# Altium integrated library CMR_Miscellaneous_Devices.IntLib: 110 symbols (continued)
## LMR23630-Q1
designator U?
Manufacturer: Texas Instruments; Manufacturer Part Number: LMR23630AFQDDARQ1; Function: Step-Down; Output Configuration: Positive; Topology: Buck; Output Type: Adjustable; Number of Outputs: 1; Voltage - Input (Min): 4.5V; Voltage - Input (Max): 36V; Voltage - Output (Min/Fixed): 1V; Voltage - Output (Max): 28V; Current - Output: 3A; Frequency - Switching: 400kHz; Synchronous Rectifier: Yes; Supplier 1: Digi-Key; RoHS: RoHS Compliant; Category: Integrated Circuits (ICs); Stock 1: 1636; Pricing 1: 1=3.97, 10=3.564, 100=2.9204, 500=2.48604, 1000=2.09667 (USD); Packaging: Digi-Reel®; Part Status: Active; Operating Temperature: -40°C ~ 125°C (TJ); Mounting Type: Surface Mount; Package / Case: 8-SOIC (0.154", 3.90mm Width) Exposed Pad; Supplier Device Package: 8-SO PowerPad; ComponentLink1URL: http://www.ti.com/lit/ds/symlink/lmr23630-q1.pdf; ComponentLink1Description: http://www.ti.com/lit/ds/symlink/lmr23630-q1.pdf; Supplier Part Number 1: 296-45260-6-ND
footprint DDA0008E_N (SOP, 8-Leads, Body 4x5mm, Pitch 1.27mm, Thermal Pad 2.4x3.1mm, IPC Medium Density)
pins: 1 SW, 2 BOOT, 3 VCC, 4 FB (in), 5 EN/SYNC (in), 6 AGND, 7 VIN, 8 PGND, 9 PAD

## LRTB R98G RGB LED
designator D?, comment LRTB R98G
L98B R98G SMT RGB LED; Manufacturer: OSRAM; Datasheet: http://www.osram-os.com/Graphics/XPic9/00196779_0.pdf/LRTB%20R98G%20-%20Multi%20CHIPLED.pdf; Manufacturer Part Number: LRTB R98G; Supplier 1: Mouser; Supplier Part Number 1: 720-LRTBR98GR5T1S7T7
footprint LRTB R98G RGB LED (OSRAM SMT RGB LED LRTB R98G)
pins: 1, 2, 3, 4, 5, 6

## LTP-3784E
designator *  Supplier Part Number 1: 160-1010-ND
LED ALPHNUM.54" 2DGT RED-ORNG CC; Manufacturer: Lite-On Inc.; Manufacturer Part Number: LTP-3784E; Number of Characters: 2; Digit/Alpha Size: 0.54" (13.72mm); Display Type: 14-Segment, Alphanumeric; Common Pin: Common Cathode; Voltage - Forward (Vf) (Typ): 2V; Current - Test: 20mA; Millicandela Rating: 2.3mcd; Wavelength - Peak: 630nm; Power Dissipation (Max): 75mW; Supplier 1: Digi-Key; RoHS: RoHS Compliant; Category: Optoelectronics; Stock 1: 4674; Pricing 1: 1=3.78, 10=3.154, 25=2.6492, 100=2.2707, 250=2.0184, 500=1.82918, 1000=1.6778, 2500=1.60841, 5000=1.57688 (USD); Packaging: Tube; Part Status: Active; Size / Dimension: 0.833" H x 0.989" W x 0.307" D (21.15mm x 25.12mm x 7.80mm); Color: Orange-Red; Package / Case: 18-DIP; ComponentLink1URL: http://optoelectronics.liteon.com/upload/download/DS-30-96-084/S_110_P3784E.pdf; ComponentLink1Description: http://optoelectronics.liteon.com/upload/download/DS-30-96-084/S_110_P3784E.pdf
footprint Lite-On LTP-3784E
pins: 1 E, 2 M, 4 L, 5 K, 6 J, 7 D, 8 NP, 9 C, 10 B, 11 COM2, 12 A, 13 N, 14 H, 15 G, 16 COM1, 17 P, 18 F

## Main Board 15e
designator P?, comment Main Board Connection
15e's Main Board
footprint Main Board 15e (15e Main Board connection for DAQ node)
pins: 1, 2, 3, 4
text: VCC; MCU; GND; CANH; CANL

## MAX6955ATL+
designator *  Supplier Part Number 1: MAX6955ATL+-ND
IC DRVR DSPL LED 40-TQFN; Manufacturer: Maxim Integrated; Manufacturer Part Number: MAX6955ATL+; Configuration: 7, 14, 16 Segment; Interface: I²C; Current - Supply: 22mA; Voltage - Supply: 2.7 V ~ 5.5 V; Supplier 1: Digi-Key; RoHS: RoHS Compliant; Category: Integrated Circuits (ICs); Stock 1: 171; Pricing 1: 1=16.05, 10=15.248, 25=12.57, 50=11.9416, 250=11.571, 500=10.2765 (USD); Packaging: Tube; Part Status: Active; Display Type: LED; Digits or Characters: -; Operating Temperature: -40°C ~ 125°C; Mounting Type: Surface Mount; Package / Case: 40-WFQFN Exposed Pad; Supplier Device Package: 40-TQFN-EP (6x6); ComponentLink1URL: http://datasheets.maximintegrated.com/en/ds/MAX6955.pdf; ComponentLink1Description: http://datasheets.maximintegrated.com/en/ds/MAX6955.pdf
footprint QFN50P600X600X80_HS-41N (QFN, 40-Leads, Body 6.00x6.00mm, Pitch 0.50mm, Thermal Pad 4.10x4.10mm, IPC Medium Density)
pins: 1 AD1, 2 O0, 3 O1, 4 O2, 5 O3, 6 O4, 7 O5, 8 O6, 9 O7, 10 O8, 12 GND, 13 GND, 14 ISET, 15 GND, 16 V+, 17 OSC, 18 V+, 19 V+, 21 O9, 22 O10, 23 O11, 24 O12, 25 O13, 26 O14, 27 O15, 28 O16, 29 O17, 30 O18, 31 BLINK, 32 OSC_OUT, 33 P2, 34 P3, 35 P4/IRQ, 36 P0, 37 P1, 38 AD0, 39 SDA, 40 SCL

## MAX9860
designator *
footprint MAX9860
pins: 1 MICBIAS, 2 REG, 3 PREG, 4 REF, 5 AGND (power), 6 AVDD (power), 7 OUTP (out), 8 OUTN (out), 9 SDA (out), 10 SCL (in), 11 DVDDIO (power), 12 DGND (power), 13 DVDD (power), 14 MCLK (in), 15 SDOUT (out), 16 SDIN (in), 17 LRCLK (io), 18 BCLK (io), 19 ~{IRQ} (out), 20 MICRN (in), 21 MICRP (in), 22 MICLN (in), 23 MICLP (in), 24 MICGND (power), 25 EP (power)

## MAXI PC AUTO-FUSE SOCKET
designator F?, comment 500VAC 40A
FUSE BLOCK BLADE 500V 40A PCB; Manufacturer Part Number: 3555-2; Manufacturer: Keystone Electronics; Voltage Rating: 500V (AC); Current Rating: 40A; Datasheet URL: http://www.keyelco.com/userAssets/file/M60-2p38.pdf
footprint MAXI PC AUTO-FUSE SOCKET (FUSE BLOCK BLADE 500V 40A PCB)
pins: 1, 2

## Mentor Light Pipe for LED, 2 x 5MM
designator MP?, comment 1274.1011
Single LED Light Guide - 2mm x 5mm, 15mm height; Manufacturer: Mentor; Manufacturer Part Number: 1274.1011; Datasheet: http://www.tme.eu/en/Document/145e8fcdcc8fe86a85cd92160bd5d5db/1274.1011.pdf; Supplier 1: Farnell; Supplier Part Number 1: 2300569
footprint MENTOR 1274.1011 (MENTOR LIGHTPIPE FOR LED, 2 x 5MM)

## Mentor Quad Light Pipe for LED, 2 x 3MM
designator MP?, comment 1296.4134
LED Light Guide Array - 2mm x 3mm, 15mm height, 4 guides; Manufacturer: Mentor; Manufacturer Part Number: 1296.4134; Datasheet: http://www.farnell.com/datasheets/1693513.pdf; Supplier 1: Farnell; Supplier Part Number 1: 2300661
footprint MENTOR 1296.4134 (MENTOR QUAD LIGHTPIPE FOR LED, 2 x 3MM)

## MFU0805FF00750P100
designator F?
750mA, 32Vdc, SMT, Fast Blow, 0805; Breaking Capacity: 50 A; Current Rating: 750 mA; Voltage Rating: 32 Vdc; Package: 0805; Supplier 1: Digi-Key; Supplier Part Number 1: MFU0805.75CT-ND
footprint MFU Series 0805 (SMT Fuse, 0805, Vishay MFU Series)
pins: 1, 2

## MicroSD
designator P?
MicroSD card reader
footprint MicroSD
pins: 1 CD, 2 CS, 3 DI, 4 DO, 5 CLK, 6 GND, 7 3V, 8 5V

## Molex 0473080001
designator *
CONN SIM CARD PUSH-PULL R/A SMD
footprint Molex 0473080001
pins: 0 PAD, 1 C1, 2 C2, 3 C3, 5 C5, 6 C6, 7 C7

## NHD-320240WX
designator *
footprint NHD-320240WX (LCD Display)

## NTCG103JF103FT1S
designator RT?, comment value 10k  Tolerance: 1%  Supplier 1: Digi-Key  Supplier Part Number 1: 445-174506-6-ND  (hidden comment: NTC THERMISTOR 10K OHM 1% 0402)
Datasheet: http://www.bitechnologies.com/pdfs/22.pdf
footprint NTCG103JF103FT1S
pins: 1, 2
text: -temp

## NTCS0805E3103JHT
designator R?
NTC THERMISTOR R_25C = 10k, B=3380K; mfg p#: NTCG163JF103FTDS; Supplier Part #: 445-174516-1-ND; Datasheet: https://product.tdk.com/info/en/catalog/datasheets/503022/tpd_automotive_ntc-thermistor_ntcg_en.pdf
footprint 0603 NTC Thermistor (THERMISTOR NTC 10KOHM 3380K 0603)
pins: 1, 2
text: -temp

## Ohmite FCSL150R005FERCT
designator R?, comment 2m 1%
2m 1% 10W SMD Shunt Resistor; ComponentLink1Description: digikey; ComponentLink1URL: https://www.digikey.com/product-detail/en/ohmite/FCSL150R005FER/FCSL150R005FERCT-ND/4976432
footprint FCSL150
pins: 1, 2

## On-Off Power Button / Pushbutton Toggle Switch:1683
designator S?, comment Switchy Boi
On-Off Power Button / Pushbutton Toggle Switch:1683
footprint Pushbutton Toggle Switch (On-Off Power Button / Pushbutton Toggle Switch:1683)
pins: 1, 2

## OpenLog
designator U?  (value not drawn)
Open Source Data Logger; Datasheet: https://github.com/sparkfun/OpenLog/wiki/datasheet
footprint OpenLog (Openlog serial data logger)
pins: 1 GRN, 2 RXI, 3 TXO, 4 VCC, 5 GND, 6 BLK

## OSRAM LS R976
designator D?, comment LS R976  Color: Red
OSRAM CHIPLED 0805 Red, LSR976; Datasheet: http://www.osram-os.com/Graphics/XPic8/00078896_0.pdf; Manufacturer: OSRAM; Manufacturer Part Number: LS R976; Supplier 1: Digi-Key; Supplier Part Number 1: 475-1278-1-ND
footprint OSRAM LS R976 (OSRAM CHIPLED 0805 RED)
pins: 1, 2

## Panasonic EEE-1CA470WR
designator C?, comment CAP 47uF
16V 47uF Electrolytic Capacitor; Part: PCE4848CT-ND; Rated Voltage: 50 V; Capacitance: 1000 uF; Tolerance: 20%; Chemistry: Aluminum Electrolytic; Supplier: Digikey; ComponentLink1Description: digikey; ComponentLink1URL: https://www.digikey.com/product-detail/en/panasonic-electronic-components/EEE-1CA470WR/PCE3890TR-ND/766057
footprint EEE-1CA470WR
pins: 1, 2
text: +

## Panasonic EEEFK1H102AM
designator C?, comment CAP 1000uF
50V 1000uF Electrolytic Capacitor; Part: PCE4848CT-ND; Tolerance: 20%; Chemistry: Aluminum Electrolytic; Rated Voltage: 50 V; Capacitance: 1000 uF; Supplier: Digikey; ComponentLink1Description: Digikey; ComponentLink1URL: https://www.digikey.com/product-detail/en/panasonic-electronic-components/EEE-FK1H102AM/PCE4848CT-ND/1879879
footprint EEEFK1H102AM
pins: 1, 2
text: +

## Particle_Photon
designator U*, comment Particle Photon
footprint Particle Photon
footprint PARTICLE_PHOTON_SMD
pins: 1 VIN, 2 GND, 3 TX, 4 RX, 5 WKUP, 6 DAC, 7 A5, 8 A4, 9 A3, 10 A2, 11 A1, 12 A0, 13 D0, 14 D1, 15 D2, 16 D3, 17 D4, 18 D5, 19 D6, 20 D7, 21 GND, 22 VBAT, 23 ~{RST}, 24 3V3

## PE-68386NL
designator T?
Transformers Audio & Signal THT Gate Drive 785uH .6Ohms; Part Number: PE-68386NL; Supplier: Mouser; Supplier Part Number: 673-PE-68386NL; Datasheet URL: www.mouser.com/ds/2/336/-179963.pdf
pins: 1, 3, 4, 6

## PESD1CAN-UX
designator D?  Supplier Part Number 1: 1727-1306-1-ND
TVS DIODE 24VWM 50VC SC70; Supplier 1: Digi-Key
footprint SOT65P210X110-3N (SOT23, 3-Leads, Body 2.00x2.10mm, Pitch 0.65mm, IPC Medium Density)
pins: 1, 2, 3

## PESD5V0U1UA
designator D?
TVS DIODE 5VWM SOD3232; Part Number: PESD5V0U1UA,115; Supplier: DigiKey; Supplier Part Number: 568-4670-1-ND; Datasheet URL: http://assets.nexperia.com/documents/data-sheet/PESD5V0U1UA_UB_UL.pdf
footprint PESD5V0U1UA (SODFL, 2-Leads, Body 1.25x2.50mm, IPC Medium Density)
pins: 1 NPNB (oc), 2 NPNB (oc)

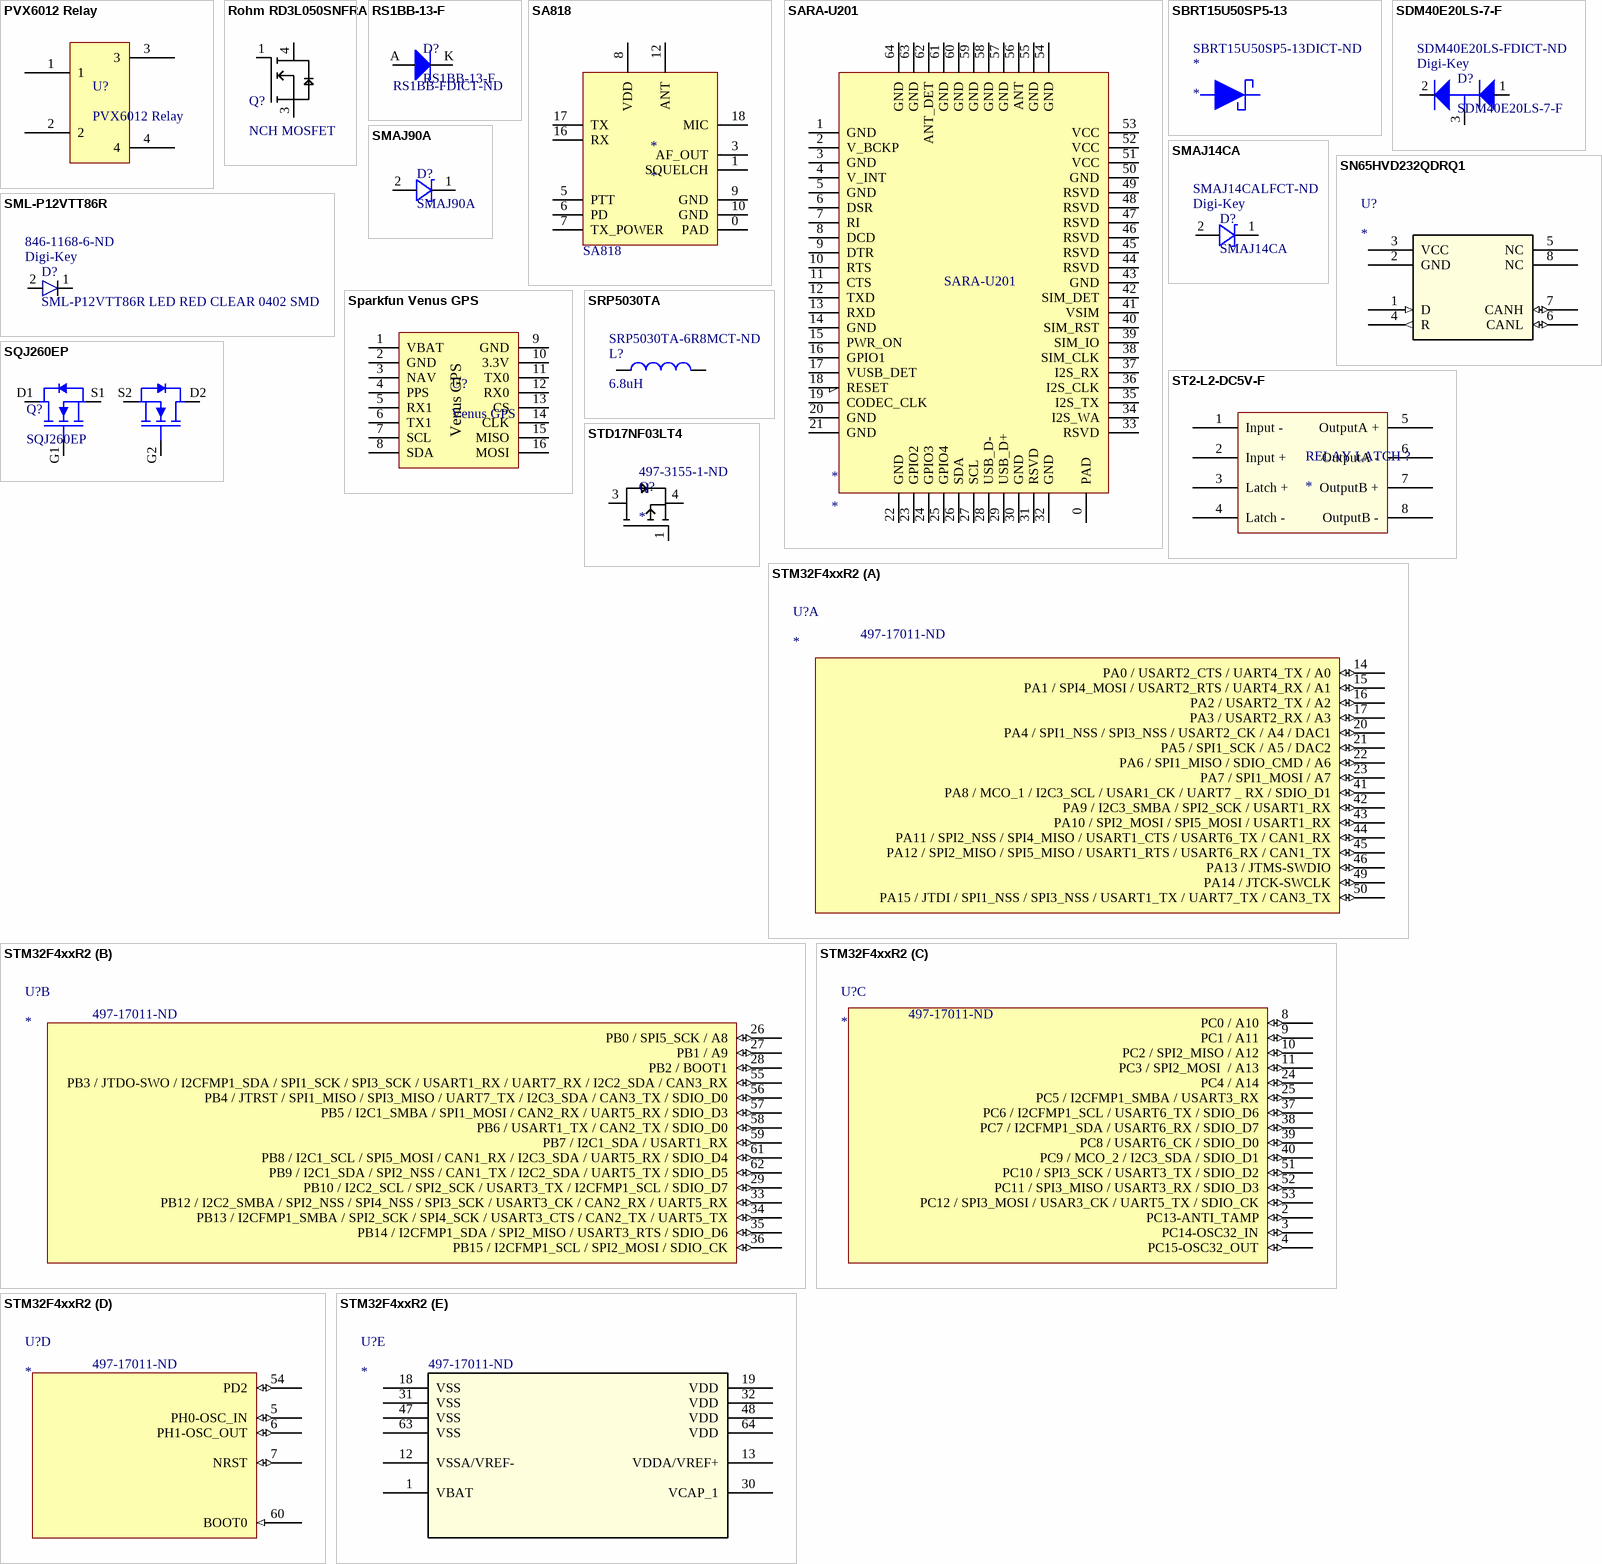
[diagram p2: symbols PVX6012 Relay to STM32F4xxR2]

## PVX6012 Relay
designator U?
IC RELAY PHOTOVO 400V 1A 14-DIP; Part Number: PVX6012PBF; Source Part Number: PVX6012PBF-ND; Source: Digi-key; Datasheet: http://www.irf.com/product-info/datasheets/data/pvx6012.pdf
footprint PVX6012 Relay (PVS6012 Relay)
pins: 1, 2, 3, 4

## Rohm RD3L050SNFRA
designator Q?, comment NCH MOSFET
AUTOMOTIVE NCH 60V 5A POWER MOSFET; ComponentLink1Description: digikey; ComponentLink1URL: https://www.digikey.com/product-detail/en/rohm-semiconductor/RD3L050SNFRATL/RD3L050SNFRATLCT-ND/9561230
footprint DPAK230P1000X230-3N (D-PAK, 3-Pads, Body 6.30x6.76mm (max), IPC Medium Density)
pins: 1, 3, 4

## RS1BB-13-F
designator D?  Supplier Part Number 1: RS1BB-FDICT-ND
Diode, 100V 1A 1.3V forward voltage; Datasheet: http://www.diodes.com/_files/datasheets/ds15002.pdf; Supplier 1: Digi-Key
footprint RS1BB-13-F
pins: A, K

## SA818
designator *  Part Number: SA818
Walkie-Talkie Module; Datasheet: http://www.dorji.com/docs/data/DRA818U.pdf
footprint SA818
pins: 0 PAD, 1 SQUELCH, 3 AF_OUT, 5 PTT, 6 PD, 7 TX_POWER, 8 VDD, 9 GND, 10 GND, 12 ANT, 16 RX, 17 TX, 18 MIC

## SARA-U201
designator *  Part Number: SARA-U201
Cellular Module
footprint SARA-U2 (Cellular Module)
pins: 0 PAD "Ground all central pads", 1 GND, 2 V_BCKP, 3 GND, 4 V_INT, 5 GND, 6 DSR, 7 RI, 8 DCD, 9 DTR, 10 RTS, 11 CTS, 12 TXD, 13 RXD, 14 GND, 15 PWR_ON, 16 GPIO1, 17 VUSB_DET, 18 RESET, 19 CODEC_CLK, 20 GND, 21 GND, 22 GND, 23 GPIO2, 24 GPIO3, 25 GPIO4, 26 SDA, 27 SCL, 28 USB_D-, 29 USB_D+, 30 GND, 31 RSVD, 32 GND, 33 RSVD, 34 I2S_WA, 35 I2S_TX, 36 I2S_CLK, 37 I2S_RX, 38 SIM_CLK, 39 SIM_IO, 40 SIM_RST, 41 VSIM, 42 SIM_DET, 43 GND, 44 RSVD, 45 RSVD, 46 RSVD, 47 RSVD, 48 RSVD, 49 RSVD, 50 GND, 51 VCC, 52 VCC, 53 VCC, 54 GND, 55 GND, 56 ANT, 57 GND, 58 GND, 59 GND, 60 GND, 61 GND, 62 ANT_DET, 63 GND, 64 GND

## SBRT15U50SP5-13
designator *  Supplier Part Number 1: SBRT15U50SP5-13DICT-ND
Supplier 1: Digi-Key
footprint SBRT15U50SP5-13
pins: 1, 2

## SDM40E20LS-7-F
designator D?  Supplier 1: Digi-Key  Supplier Part Number 1: SDM40E20LS-FDICT-ND
Diode Array 1 Pair Series Connection Schottky 20V 400mA (DC) Surface Mount SOT-23-3; ComponentLink1Description: Digikey Link; ComponentLink1URL: https://www.digikey.com/product-detail/en/diodes-incorporated/SDM40E20LS-7-F/SDM40E20LS-FDICT-ND/815980; ComponentLink2Description: Datasheet; ComponentLink2URL: https://www.diodes.com/assets/Datasheets/ds30298.pdf
footprint SOT-23-3_ SDM40E20LS-7-F (SOT23, 3-Leads, Body 2.93x2.40mm, Pitch 0.95mm, IPC Medium Density)
pins: 1, 2, 3

## SMAJ14CA
designator D?  Supplier 1: Digi-Key  Supplier Part Number 1: SMAJ14CALFCT-ND
TVS DIODE 14VWM 23.2VC SMA; Part Number: SMAJ90A-E3/61; Supplier: DigiKey; Supplier Part Number: SMAJ90A-E3/61GICT-ND; Datasheet URL: http://www.vishay.com/docs/88390/smaj50a.pdf; ComponentLink1Description: Digikey Link; ComponentLink1URL: https://www.digikey.com/product-detail/en/littelfuse-inc/SMAJ14CA/SMAJ14CALFCT-ND/762487
footprint SMAJ14CA (Molded Diode, 2-Leads, Body 4.25x2.67mm, IPC Medium Density)
pins: 1 (power), 2 (power)

## SMAJ90A
designator D?
TVS DIODE 90VWM 146VC SMA; Part Number: SMAJ90A-E3/61; Supplier: DigiKey; Supplier Part Number: SMAJ90A-E3/61GICT-ND; Datasheet URL: http://www.vishay.com/docs/88390/smaj50a.pdf
footprint SMAJ90A (Molded Diode, 2-Leads, Body 4.25x2.67mm, IPC Medium Density)
pins: 1 NPNB (oc), 2 NPNB (oc)

## SML-P12VTT86R
designator D?, comment SML-P12VTT86R LED RED CLEAR 0402 SMD  Supplier 1: Digi-Key  Supplier Part Number 1: 846-1168-6-ND
Red 630nm LED Indication - Discrete 2V 0402; Vf @ 20mA: 3.4V (typ); Derated Current: 5 mA; Color: Blue; PN: LTST-C191TBKT; ComponentLink1Description: Digikey Link; ComponentLink1URL: https://www.digikey.com/product-detail/en/rohm-semiconductor/SML-P12VTT86R/846-1168-1-ND/5011427
footprint LED 0402
pins: 1, 2

## SN65HVD232QDRQ1
designator U?
Imported; Manufacturer: Texas Instruments; Manufacturer_Part_Number: SN65HVD232QDRQ1; Built_By: EMA_UL_Team; C: Copyright (C) 2015 Accelerated Designs. All rights reserved; Vendor: Texas Instruments; RefDes: RefDes; Type: DEV; Value: Value
footprint D8
pins: 1 D (in), 2 GND (power), 3 VCC (power), 4 R (out), 5 NC, 6 CANL (io), 7 CANH (io), 8 NC

## Sparkfun Venus GPS
designator U?, comment Venus GPS
Sparkfun Venus GPS Module
footprint Sparkfun Venus GPS (Sparkfun Venus GPS Module)
pins: 1 VBAT, 2 GND, 3 NAV, 4 PPS, 5 RX1, 6 TX1, 7 SCL, 8 SDA, 9 GND, 10 3.3V, 11 TX0, 12 RX0, 13 CS, 14 CLK, 15 MISO, 16 MOSI

## SQJ260EP
designator Q?
Automotive Dual N-Channel 60 V (D-S) 175 °C MOSFETs; Supplier: Digikey; Part Number: SQJ260EP; Supplier Part Number: SQJ260EP-T1_GE3CT-ND; Datasheet URL: https://www.diodes.com/assets/Datasheets/ds30896.pdf
footprint SQJ260EP (Automotive Dual N-Channel 60 V (D-S) 175 °C MOSFETs)
pins: D1, D2, G1, G2, S1, S2

## SRP5030TA
designator L?, comment 6.8uH  Supplier Part Number 1: SRP5030TA-6R8MCT-ND
Manufacturer: Bourns Inc.; Manufacturer Part Number: SRP5030TA-6R8M; Type: Wirewound; Material - Core: Carbonyl Powder; Tolerance: ±20%; Shielding: Shielded; DC Resistance (DCR): 76.2 mOhm Max; Q @ Freq: 15 @ 100kHz; Supplier 1: Digi-Key; RoHS: RoHS Compliant; Category: Inductors, Coils, Chokes; Stock 1: 5626; Pricing 1: 1=1.51, 10=1.397, 100=0.9781, 500=0.79178, 1000=0.72191 (USD); Packaging: Cut Tape (CT); Part Status: Active; Ratings: AEC-Q200; Operating Temperature: -40°C ~ 150°C; Mounting Type: Surface Mount; Package / Case: Nonstandard; Supplier Device Package: -; Size / Dimension: 0.224" L x 0.205" W (5.70mm x 5.20mm); Height - Seated (Max): 0.118" (3.00mm); ComponentLink1URL: http://www.bourns.com/docs/Product-Datasheets/SRP5030TA.pdf; ComponentLink1Description: http://www.bourns.com/docs/Product-Datasheets/SRP5030TA.pdf
footprint BOURNS SRP5030T (Precision Wire Wound Inductor, 2-Leads, Body 5.70x5.20mm, IPC Medium Density)
pins: 1, 2

## ST2-L2-DC5V-F
designator RELAY LATCH ?
footprint ST2-L2-DC5V-F
pins: 1 Input -, 2 Input +, 3 Latch +, 4 Latch -, 5 OutputA +, 6 OutputA -, 7 OutputB +, 8 OutputB -

## STD17NF03LT4
designator Q?  Supplier Part Number 1: 497-3155-1-ND
MOSFET N-CH 30V 17A DPAK; Supplier 1: Digi-Key
footprint DPAK228P972X240-3N (D-PAK, 3-Pads, Body 6.20x6.66mm (max), IPC Medium Density)
pins: 1, 3, 4

## STM32F4xxR2
designator U?  Supplier Part Number 1: 497-17011-ND
Imported; Manufacturer_Part_Number: stm32f4xxr2; Vendor: STMicroelectronics; C: Copyright (C) 2016 Accelerated Designs. All rights reserved; Copyright: Copyright (C) 2016 Accelerated Designs. All rights reserved; RefDes: RefDes; Type: Type; Value: Value; Supplier 1: Digi-Key
footprint LQFP64-10x10mm
part A pins: 14 PA0 / USART2_CTS / UART4_TX / A0 (io), 15 PA1 / SPI4_MOSI / USART2_RTS / UART4_RX / A1 (io), 16 PA2 / USART2_TX / A2 (io), 17 PA3 / USART2_RX / A3 (io), 20 PA4 / SPI1_NSS / SPI3_NSS / USART2_CK / A4 / DAC1 (io), 21 PA5 / SPI1_SCK / A5 / DAC2 (io), 22 PA6 / SPI1_MISO / SDIO_CMD / A6 (io), 23 PA7 / SPI1_MOSI / A7 (io), 41 PA8 / MCO_1 / I2C3_SCL / USAR1_CK / UART7 _ RX / SDIO_D1 (io), 42 PA9 / I2C3_SMBA / SPI2_SCK / USART1_RX (io), 43 PA10 / SPI2_MOSI / SPI5_MOSI / USART1_RX (io), 44 PA11 / SPI2_NSS / SPI4_MISO / USART1_CTS / USART6_TX / CAN1_RX (io), 45 PA12 / SPI2_MISO / SPI5_MISO / USART1_RTS / USART6_RX / CAN1_TX (io), 46 PA13 / JTMS-SWDIO (io), 49 PA14 / JTCK-SWCLK (io), 50 PA15 / JTDI / SPI1_NSS / SPI3_NSS / USART1_TX / UART7_TX / CAN3_TX (io)
part B pins: 26 PB0 / SPI5_SCK / A8 (io), 27 PB1 / A9 (io), 28 PB2 / BOOT1 (io), 29 PB10 / I2C2_SCL / SPI2_SCK / USART3_TX / I2CFMP1_SCL / SDIO_D7 (io), 33 PB12 / I2C2_SMBA / SPI2_NSS / SPI4_NSS / SPI3_SCK / USART3_CK / CAN2_RX / UART5_RX (io), 34 PB13 / I2CFMP1_SMBA / SPI2_SCK / SPI4_SCK / USART3_CTS / CAN2_TX / UART5_TX (io), 35 PB14 / I2CFMP1_SDA / SPI2_MISO / USART3_RTS / SDIO_D6 (io), 36 PB15 / I2CFMP1_SCL / SPI2_MOSI / SDIO_CK (io), 55 PB3 / JTDO-SWO / I2CFMP1_SDA / SPI1_SCK / SPI3_SCK / USART1_RX / UART7_RX / I2C2_SDA / CAN3_RX (io), 56 PB4 / JTRST / SPI1_MISO / SPI3_MISO / UART7_TX / I2C3_SDA / CAN3_TX / SDIO_D0 (io), 57 PB5 / I2C1_SMBA / SPI1_MOSI / CAN2_RX / UART5_RX / SDIO_D3 (io), 58 PB6 / USART1_TX / CAN2_TX / SDIO_D0 (io), 59 PB7 / I2C1_SDA / USART1_RX (io), 61 PB8 / I2C1_SCL / SPI5_MOSI / CAN1_RX / I2C3_SDA / UART5_RX / SDIO_D4 (io), 62 PB9 / I2C1_SDA / SPI2_NSS / CAN1_TX / I2C2_SDA / UART5_TX / SDIO_D5 (io)
part C pins: 2 PC13-ANTI_TAMP (io), 3 PC14-OSC32_IN (io), 4 PC15-OSC32_OUT (io), 8 PC0 / A10 (io), 9 PC1 / A11 (io), 10 PC2 / SPI2_MISO / A12 (io), 11 PC3 / SPI2_MOSI  / A13 (io), 24 PC4 / A14 (io), 25 PC5 / I2CFMP1_SMBA / USART3_RX (io), 37 PC6 / I2CFMP1_SCL / USART6_TX / SDIO_D6 (io), 38 PC7 / I2CFMP1_SDA / USART6_RX / SDIO_D7 (io), 39 PC8 / USART6_CK / SDIO_D0 (io), 40 PC9 / MCO_2 / I2C3_SDA / SDIO_D1 (io), 51 PC10 / SPI3_SCK / USART3_TX / SDIO_D2 (io), 52 PC11 / SPI3_MISO / USART3_RX / SDIO_D3 (io), 53 PC12 / SPI3_MOSI / USAR3_CK / UART5_TX / SDIO_CK (io)
part D pins: 5 PH0-OSC_IN (io), 6 PH1-OSC_OUT (io), 7 NRST (io), 54 PD2 (io), 60 BOOT0 (in)
part E pins: 1 VBAT (power), 12 VSSA/VREF- (power), 13 VDDA/VREF+ (power), 18 VSS (power), 19 VDD (power), 30 VCAP_1 (power), 31 VSS (power), 32 VDD (power), 47 VSS (power), 48 VDD (power), 63 VSS (power), 64 VDD (power)

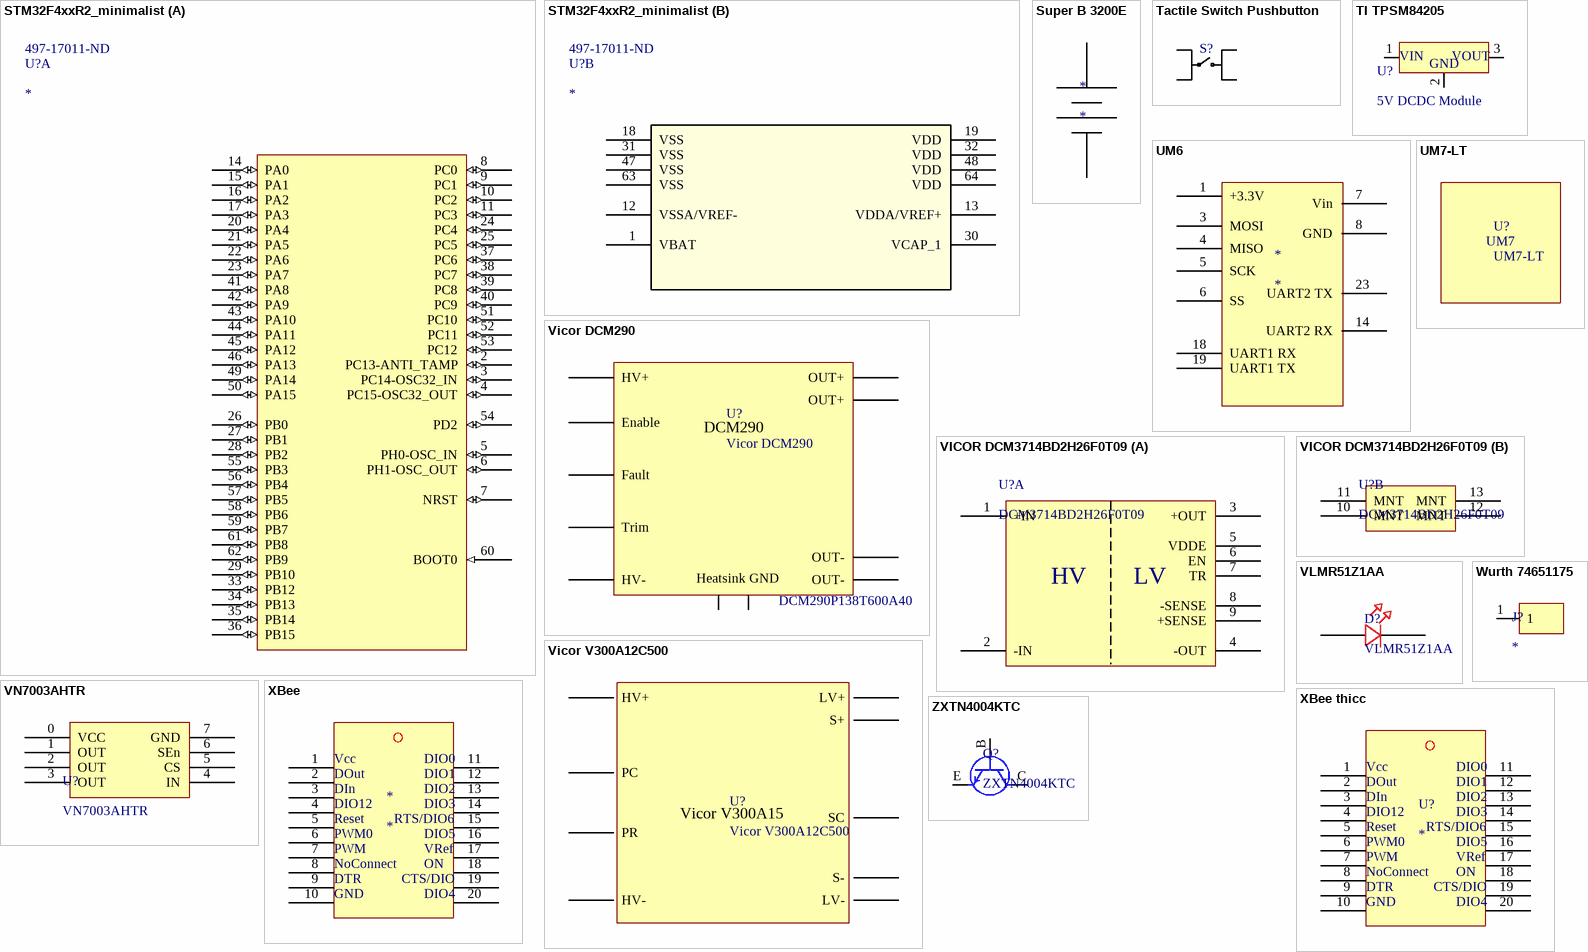
[diagram p3: symbols STM32F4xxR2_minimalist to ZXTN4004KTC]

## STM32F4xxR2_minimalist
designator U?  Supplier Part Number 1: 497-17011-ND
Imported; Manufacturer_Part_Number: stm32f4xxr2; Vendor: STMicroelectronics; C: Copyright (C) 2016 Accelerated Designs. All rights reserved; Copyright: Copyright (C) 2016 Accelerated Designs. All rights reserved; RefDes: RefDes; Type: Type; Value: Value; Supplier 1: Digi-Key
footprint LQFP64-10x10mm
part A pins: 2 PC13-ANTI_TAMP (io), 3 PC14-OSC32_IN (io), 4 PC15-OSC32_OUT (io), 5 PH0-OSC_IN (io), 6 PH1-OSC_OUT (io), 7 NRST (io), 8 PC0 (io), 9 PC1 (io), 10 PC2 (io), 11 PC3 (io), 14 PA0 (io), 15 PA1 (io), 16 PA2 (io), 17 PA3 (io), 20 PA4 (io), 21 PA5 (io), 22 PA6 (io), 23 PA7 (io), 24 PC4 (io), 25 PC5 (io), 26 PB0 (io), 27 PB1 (io), 28 PB2 (io), 29 PB10 (io), 33 PB12 (io), 34 PB13 (io), 35 PB14 (io), 36 PB15 (io), 37 PC6 (io), 38 PC7 (io), 39 PC8 (io), 40 PC9 (io), 41 PA8 (io), 42 PA9 (io), 43 PA10 (io), 44 PA11 (io), 45 PA12 (io), 46 PA13 (io), 49 PA14 (io), 50 PA15 (io), 51 PC10 (io), 52 PC11 (io), 53 PC12 (io), 54 PD2 (io), 55 PB3 (io), 56 PB4 (io), 57 PB5 (io), 58 PB6 (io), 59 PB7 (io), 60 BOOT0 (in), 61 PB8 (io), 62 PB9 (io)
part B pins: 1 VBAT (power), 12 VSSA/VREF- (power), 13 VDDA/VREF+ (power), 18 VSS (power), 19 VDD (power), 30 VCAP_1 (power), 31 VSS (power), 32 VDD (power), 47 VSS (power), 48 VDD (power), 63 VSS (power), 64 VDD (power)

## Super B 3200E
designator *
footprint Super B 3200 Terminals (Plated mounting holes to place on top of Super B 3200 and screw onto it. M5 Screws, 3.072" center-to-center spacing)
pins: 1 Negative, 2 Positive

## Tactile Switch Pushbutton
designator S?
footprint Tactile Switch Pushbutton
pins: 1, 2, 3, 4

## TI TPSM84205
designator U?, comment 5V DCDC Module
ComponentLink1Description: digikey; ComponentLink1URL: https://www.digikey.com/product-detail/en/texas-instruments/TPSM84205EAB/296-47074-ND/7561620
footprint TPSM84205
pins: 1, 2, 3
text: VIN; VOUT; GND

## UM6
designator *
footprint UM6
pins: 1 +3.3V, 3 MOSI, 4 MISO, 5 SCK, 6 SS, 7 Vin, 8 GND, 14 UART2 RX, 18 UART1 RX, 19 UART1 TX, 23 UART2 TX

## UM7-LT
designator U?
UM7-LT Orientation Sensor; Manufacturer: CHRobotics; Part Number: UM7-LT; Datasheet: https://www.chrobotics.com/docs/UM7_Datasheet.pdf; Created By: ayabroud
footprint UM7-LT (UM7-LT Orientation Sensor)
text: UM7

## Vicor DCM290
designator U?  Manufacturer Part Number: DCM290P138T600A40
Vicor DCM290 DC/DC Converter, 13.8V Nominal Output, 600W; Input Voltage: 160V - 420V (for 500W output); Manufacturer: Vicor; Datasheet: http://www.vicorpower.com/documents/datasheets/ds_DCM290y138x600A40.pdf; Supplier 1: Digi-Key; Supplier Part Number 1: 1102-5388-ND; Output Voltage: 13.8V; Max Power: 600W
footprint Vicor DCM290 (DC-DC Converter)
pins: EN Enable, FT Fault, IN+ HV+ (power), IN- HV- (power), M5, M6, OUT+_1 OUT+, OUT+_2 OUT+, OUT-_1 OUT-, OUT-_2 OUT-, TR Trim
text: DCM290; Heatsink GND

## VICOR DCM3714BD2H26F0T09
designator U?, comment DCM3714BD2H26F0T09
Isolated Module DC DC Converter 1 Output 24V 25A 200V - 420V Input; Manufacturer 1: Vicor; Number of Outputs: 1; Isolation Voltage: 2.121kV; Efficiency: 93%; Max Power Dissipation: 600W; Supplier 1: Digi-Key; Supplier Part Number 1: 1102-5548-ND; Manufacturer Part Number 1: DCM3714BD2H26F0T09; Stock 1: 114; Pricing 1: 1=500.03, 10=475.025 (USD); Mount: Through Hole; Min Operating Temperature: -40°C; Max Operating Temperature: 125°C; Packaging: Box; Min Input Voltage: 200V; Max Input Voltage: 420V; Voltage - Output 1: 24V; Max Output Current: 25A; Features: UVLO,OVP; Length: 3.83inch; Height: 0.37inch; Width: 1.4inch; Lead Free: Lead Free
footprint DCM3714BD2H26F0T09
part A pins: 1 +IN, 2 -IN, 3 +OUT, 4 -OUT, 5 VDDE, 6 EN, 7 TR, 8 -SENSE, 9 +SENSE
part B pins: 10 MNT, 11 MNT, 12 MNT, 13 MNT
part A text: HV; LV

## Vicor V300A12C500
designator U?
Manufacturer: Vicor Corporation; Manufacturer Part Number: V300A12C500BL; Number of Outputs: 1; Voltage - Input (Min): 180V; Voltage - Input (Max): 375V; Voltage - Output 1: 12V; Current - Output (Max): 41.67A; Power (Watts): 500W; Voltage - Isolation: 3kV (3000V); Efficiency: 86%; Supplier 1: Digi-Key; RoHS: RoHS non-compliant; Category: Power Supplies - Board Mount; Stock 1: 5; Pricing 1: 1=299.93, 10=290.25 (USD); Packaging: Bulk; Part Status: Active; Type: Isolated Module; Voltage - Output 2: -; Voltage - Output 3: -; Applications: ITE (Commercial); Features: OVP, UVLO; Operating Temperature: -20°C ~ 100°C; Mounting Type: Through Hole; Package / Case: Full Brick; Size / Dimension: 4.60" L x 2.20" W x 0.62" H (116.8mm x 55.9mm x 15.7mm); ComponentLink1URL: http://cdn.vicorpower.com/documents/datasheets/ds_300vin-maxi-family.pdf; ComponentLink1Description: http://cdn.vicorpower.com/documents/datasheets/ds_300vin-maxi-family.pdf; Supplier Part Number 1: 1102-1316-ND
footprint VICOR V300A12C500
pins: HV+ (power), HV- (power), LV+, LV-, PC, PR, S+, S-, SC
text: Vicor V300A15

## VLMR51Z1AA
designator D?
Manufacturer: Vishay; Part Number: VLMR51Z1AA; Supplier 1: Digi-Key; Supplier Part Number 1: VLMR51Z1AA-GS08TR-ND; Datasheet: http://www.vishay.com/docs/83419/vlmr51.pdf
footprint VLMR51Z1AA (VLMR51Z1AA SMT LED)
pins: 1, 2

## VN7003AHTR
designator U?
IC PWR SWITCH N-CH 1:1 OCTAPACK; Manufacturer: STMicroelectronics; Manufacturer Part #: VN7003AHTR; Supplier: Digikey; Supplier Part #: 497-16716-6-ND
footprint OCTAPAK-7+1
pins: 0 VCC, 1 OUT, 2 OUT, 3 OUT, 4 IN, 5 CS, 6 SEn, 7 GND

## Wurth 74651175
designator J?
Screw Connector Terminal, M5 bolt threading; Maunfacturer: Wurth; Current Rating: 50A; Bolt Threading: M6; Supplier 1: Digi-Key; Supplier Part Number 1: 732-10906-1-ND; Mounting Type: Through Hole; Contact Finish: Tin; Contact Material: Brass; Number of Pins: 4
footprint 74651175
pins: 1

## XBee
designator *
XBee
footprint Xbee
pins: 1, 2, 3, 4, 5, 6, 7, 8, 9, 10, 11, 12, 13, 14, 15, 16, 17, 18, 19, 20
text: Vcc; DIO0; DOut; DIO1; DIn; DIO2; DIO12; DIO3; Reset; RTS/DIO6; PWM0; DIO5; PWM; VRef; NoConnect; ON; DTR; CTS/DIO; GND; DIO4

## XBee thicc
designator U?
XBee
footprint Xbee - thiccc
pins: 1, 2, 3, 4, 5, 6, 7, 8, 9, 10, 11, 12, 13, 14, 15, 16, 17, 18, 19, 20
text: Vcc; DIO0; DOut; DIO1; DIn; DIO2; DIO12; DIO3; Reset; RTS/DIO6; PWM0; DIO5; PWM; VRef; NoConnect; ON; DTR; CTS/DIO; GND; DIO4

## ZXTN4004KTC
designator Q?
TRANS NPN 150V 1A TO252; Supplier: DigiKey; Part Number: ZXTN4004KTC; Supplier Part Number: ZXTN4004KTCDICT-ND; Data Sheet URL: http://www.diodes.com/_files/datasheets/ZXTN4004K.pdf
footprint ZXTN4004KTC (D-PAK, 3-Pads, Body 6.20x6.65mm (max), IPC Medium Density)
pins: B, C, E